# Altium footprint library SWLIB(150721).PcbLib: 348 footprints (part 3 of 22)
Each footprint in its own frame and in the unit in brackets; x right, y up, seen from the top. Pads: shape width x height; smd on the part's side, far side on the other; paste and mask are expansions set on the pad; w line width, h text height; cw(c..) or ccw(c..) is an arc to the next point about the centre after c.
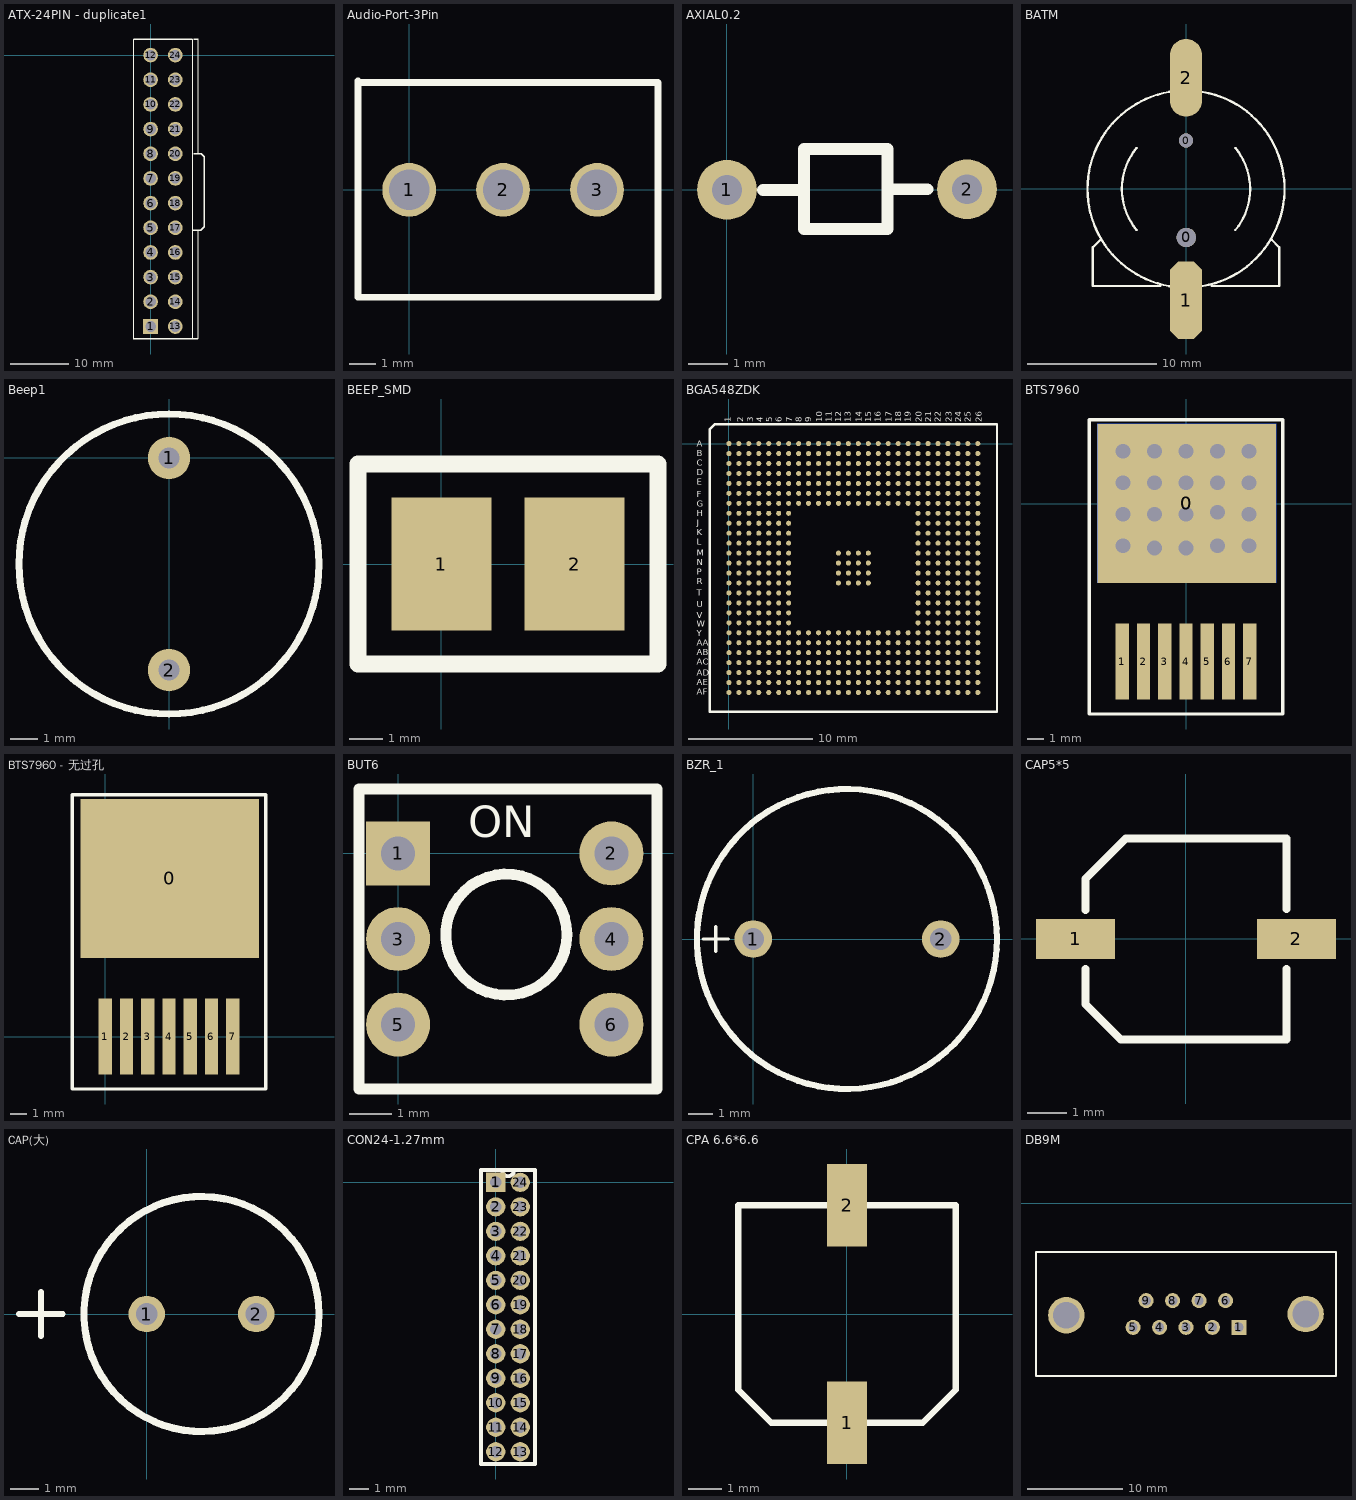
[diagram p2: the footprints below, top view; thin cyan lines are the x and y axes]

## ATX-24PIN - duplicate1 [mm]
pads (24):
  rect 2.5x2.5 hole 1.8: 1(0,-46.2)
  round 2.5 hole 1.8: 2(0,-42) 3(0,-37.8) 4(0,-33.6) 5(0,-29.4) 6(0,-25.2) 7(0,-21) 8(0,-16.8) 9(0,-12.6) 10(0,-8.4) 11(0,-4.2) 12(0,0) 13(4.216,-46.2) 14(4.216,-42) 15(4.216,-37.8) 16(4.216,-33.6) 17(4.216,-29.4) 18(4.216,-25.2) 19(4.216,-21) 20(4.216,-16.8) 21(4.216,-12.6) 22(4.216,-8.4) 23(4.216,-4.2) 24(4.216,0)
Top Overlay:
  lines w0.2: -2.896,-48.333 -2.896,2.667 ; 7.198,-48.26 7.198,2.74 ; 8.153,-48.26 8.153,-29.845 ; 8.153,-16.764 8.153,2.667
  lines w0.254: -2.896,2.667 7.104,2.667 ; -2.802,-48.26 7.198,-48.26 8.053,-48.26 ; 7.198,-29.845 8.534,-29.845 9.169,-29.21 9.169,-17.272 8.661,-16.764 7.391,-16.764 ; 7.325,2.667 8.153,2.667
Mechanical 1:
  circle w0.1: c4.217,-4.187 r0.901
  circle w0.1: c0.001,-4.187 r0.901
  circle w0.1: c4.217,0.013 r0.901
  circle w0.1: c0.001,0.013 r0.901
3D body: height 10, standoff 0.1, extent -0.902,-47.102 0.902,-45.298
3D body: height 10, standoff 0.1, extent 3.315,-47.102 5.118,-45.298
3D body: height 10, standoff 0.1, extent -0.902,-38.702 0.902,-36.898
3D body: height 10, standoff 0.1, extent 3.315,-38.702 5.118,-36.898
3D body: height 10, standoff 0.1, extent -0.902,-42.902 0.902,-41.098
3D body: height 10, standoff 0.1, extent 3.315,-42.902 5.118,-41.098
3D body: height 10, standoff 0.1, extent -0.902,-34.502 0.902,-32.698
3D body: height 10, standoff 0.1, extent 3.315,-34.502 5.118,-32.698
3D body: height 10, standoff 0.1, extent -0.902,-38.702 0.902,-36.898
3D body: height 10, standoff 0.1, extent 3.315,-38.702 5.118,-36.898
3D body: height 10, standoff 0.1, extent -0.902,-26.102 0.902,-24.298
3D body: height 10, standoff 0.1, extent 3.315,-26.102 5.118,-24.298
3D body: height 10, standoff 0.1, extent -0.902,-30.302 0.902,-28.498
3D body: height 10, standoff 0.1, extent 3.315,-30.302 5.118,-28.498
3D body: height 10, standoff 0.1, extent -0.902,-17.702 0.902,-15.898
3D body: height 10, standoff 0.1, extent 3.315,-17.702 5.118,-15.898
3D body: height 10, standoff 0.1, extent -0.902,-21.902 0.902,-20.098
3D body: height 10, standoff 0.1, extent 3.315,-21.902 5.118,-20.098
3D body: height 10, standoff 0.1, extent -0.902,-9.302 0.902,-7.498
3D body: height 10, standoff 0.1, extent 3.315,-9.302 5.118,-7.498
3D body: height 10, standoff 0.1, extent -0.902,-13.502 0.902,-11.698
3D body: height 10, standoff 0.1, extent 3.315,-13.502 5.118,-11.698
3D body: height 10, standoff 0.1, extent 3.315,-5.102 5.118,-3.298
3D body: height 10, standoff 0.1, extent -0.902,-5.102 0.902,-3.298
3D body: height 10, standoff 0.1, extent 3.315,-0.902 5.118,0.902
3D body: height 10, standoff 0.1, extent -0.902,-0.902 0.902,0.902
3D body: height 10, standoff 0.1, extent -2.845,1.829 -1.905,2.743
3D body: height 10, standoff 0.1, extent -2.946,-48.311 8.179,2.769

## Audio-Port-3Pin [mm]
pads (3):
  round 2 hole 1.5: 1(0,0) 2(3.5,0) 3(7,0)
Top Overlay:
  lines w0.254: -1.905,4 9.271,4 9.271,-4 -1.905,-4 -1.905,4.064

## AXIAL0.2 [mil]
pads (2):
  round 60 hole 30: 1(0,0) 2(240.5,0.55)
Top Overlay:
  lines w12: 36.32,0 76.32,0 ; 160.7,0.55 200.7,0.55 ; 77.05,-39.2 160.7,-39.2 160.7,40.8 77.05,40.8 77.05,-39.2

## BATM [mm]
pads (4):
  round 1.1 hole 1.1 unplated: 0(0,3.748)
  round 1.5 hole 1.5 unplated: 0(0.025,-3.752)
  oct 2.5x6 smd: 1(0,-8.602)
  oval 2.5x6 smd: 2(0,8.598)
Top Overlay:
  lines w0.178: -6.6,-3.902 -7.2,-4.502 -7.2,-7.502 -2,-7.502 ; -3.815,-3.171 cw(c0,-0.002) -3.812,3.171 ; -0.833,-7.576 cw(c0,-0.002) -7.62,-0.002 cw(c0,-0.002) -0.833,7.573 ; 0.833,-7.576 ccw(c0,-0.002) 0.833,7.573 ; 2,-7.502 7.2,-7.502 7.2,-4.502 6.625,-3.927 ; 3.81,-3.177 ccw(c0,-0.002) 3.812,3.171

## Beep1 [mil]
pads (2):
  round 60 hole 30: 1(0,0) 2(0,-300)
Top Overlay:
  circle w10: c0,-150 r212.13

## BEEP_SMD [mm]
pads (2):
  rect 3x4 smd: 1(0,0) 2(4,0)
Top Overlay:
  lines w0.5: -2.5,-3 6.5,-3 6.5,3 -2.5,3 -2.5,-3

## BGA548ZDK [mil]
pads (548):
  round 16 smd: A1(0,0) A2(31.5,0) A3(62.99,0) A4(94.49,0) A5(125.98,0) A6(157.48,0) A7(188.98,0) A8(220.47,0) A9(251.97,0) A10(283.46,0) A11(314.96,0) A12(346.46,0) A13(377.95,0) A14(409.45,0) A15(440.94,0) A16(472.44,0) A17(503.94,0) A18(535.43,0) A19(566.93,0) A20(598.43,0) A21(629.92,0) A22(661.42,0) A23(692.91,0) A24(724.41,0) A25(755.91,0) A26(787.4,0) AA1(0,-629.92) AA2(31.5,-629.92) AA3(62.99,-629.92) AA4(94.49,-629.92) AA5(125.98,-629.92) AA6(157.48,-629.92) AA7(188.98,-629.92) AA8(220.47,-629.92) AA9(251.97,-629.92) AA10(283.46,-629.92) AA11(314.96,-629.92) AA12(346.46,-629.92) AA13(377.95,-629.92) AA14(409.45,-629.92) AA15(440.94,-629.92) AA16(472.44,-629.92) AA17(503.94,-629.92) AA18(535.43,-629.92) AA19(566.93,-629.92) AA20(598.43,-629.92) AA21(629.92,-629.92) AA22(661.42,-629.92) AA23(692.91,-629.92) AA24(724.41,-629.92) AA25(755.91,-629.92) AA26(787.4,-629.92) AB1(0,-661.42) AB2(31.5,-661.42) AB3(62.99,-661.42) AB4(94.49,-661.42) AB5(125.98,-661.42) AB6(157.48,-661.42) AB7(188.98,-661.42) AB8(220.47,-661.42) AB9(251.97,-661.42) AB10(283.46,-661.42) AB11(314.96,-661.42) AB12(346.46,-661.42) AB13(377.95,-661.42) AB14(409.45,-661.42) AB15(440.94,-661.42) AB16(472.44,-661.42) AB17(503.94,-661.42) AB18(535.43,-661.42) AB19(566.93,-661.42) AB20(598.43,-661.42) AB21(629.92,-661.42) AB22(661.42,-661.42) AB23(692.91,-661.42) AB24(724.41,-661.42) AB25(755.91,-661.42) AB26(787.4,-661.42) AC1(0,-692.91) AC2(31.5,-692.91) AC3(62.99,-692.91) AC4(94.49,-692.91) AC5(125.98,-692.91) AC6(157.48,-692.91) AC7(188.98,-692.91) AC8(220.47,-692.91) AC9(251.97,-692.91) AC10(283.46,-692.91) AC11(314.96,-692.91) AC12(346.46,-692.91) AC13(377.95,-692.91) AC14(409.45,-692.91) AC15(440.94,-692.91) AC16(472.44,-692.91) AC17(503.94,-692.91) AC18(535.43,-692.91) AC19(566.93,-692.91) AC20(598.43,-692.91) AC21(629.92,-692.91) AC22(661.42,-692.91) AC23(692.91,-692.91) AC24(724.41,-692.91) AC25(755.91,-692.91) AC26(787.4,-692.91) AD1(0,-724.41) AD2(31.5,-724.41) AD3(62.99,-724.41) AD4(94.49,-724.41) AD5(125.98,-724.41) AD6(157.48,-724.41) AD7(188.98,-724.41) AD8(220.47,-724.41) AD9(251.97,-724.41) AD10(283.46,-724.41) AD11(314.96,-724.41) AD12(346.46,-724.41) AD13(377.95,-724.41) AD14(409.45,-724.41) AD15(440.94,-724.41) AD16(472.44,-724.41) AD17(503.94,-724.41) AD18(535.43,-724.41) AD19(566.93,-724.41) AD20(598.43,-724.41) AD21(629.92,-724.41) AD22(661.42,-724.41) AD23(692.91,-724.41) AD24(724.41,-724.41) AD25(755.91,-724.41) AD26(787.4,-724.41) AE1(0,-755.91) AE2(31.5,-755.91) AE3(62.99,-755.91) AE4(94.49,-755.91) AE5(125.98,-755.91) AE6(157.48,-755.91) AE7(188.98,-755.91) AE8(220.47,-755.91) AE9(251.97,-755.91) AE10(283.46,-755.91) AE11(314.96,-755.91) AE12(346.46,-755.91) AE13(377.95,-755.91) AE14(409.45,-755.91) AE15(440.94,-755.91) AE16(472.44,-755.91) AE17(503.94,-755.91) AE18(535.43,-755.91) AE19(566.93,-755.91) AE20(598.43,-755.91) AE21(629.92,-755.91) AE22(661.42,-755.91) AE23(692.91,-755.91) AE24(724.41,-755.91) AE25(755.91,-755.91) AE26(787.4,-755.91) AF1(0,-787.4) AF2(31.5,-787.4) AF3(62.99,-787.4) AF4(94.49,-787.4) AF5(125.98,-787.4) AF6(157.48,-787.4) AF7(188.98,-787.4) AF8(220.47,-787.4) AF9(251.97,-787.4) AF10(283.46,-787.4) AF11(314.96,-787.4) AF12(346.46,-787.4) AF13(377.95,-787.4) AF14(409.45,-787.4) AF15(440.94,-787.4) AF16(472.44,-787.4) AF17(503.94,-787.4) AF18(535.43,-787.4) AF19(566.93,-787.4) AF20(598.43,-787.4) AF21(629.92,-787.4) AF22(661.42,-787.4) AF23(692.91,-787.4) AF24(724.41,-787.4) AF25(755.91,-787.4) AF26(787.4,-787.4) B1(0,-31.5) B2(31.5,-31.5) B3(62.99,-31.5) B4(94.49,-31.5) B5(125.98,-31.5) B6(157.48,-31.5) B7(188.98,-31.5) B8(220.47,-31.5) B9(251.97,-31.5) B10(283.46,-31.5) B11(314.96,-31.5) B12(346.46,-31.5) B13(377.95,-31.5) B14(409.45,-31.5) B15(440.94,-31.5) B16(472.44,-31.5) B17(503.94,-31.5) B18(535.43,-31.5) B19(566.93,-31.5) B20(598.43,-31.5) B21(629.92,-31.5) B22(661.42,-31.5) B23(692.91,-31.5) B24(724.41,-31.5) B25(755.91,-31.5) B26(787.4,-31.5) C1(0,-62.99) C2(31.5,-62.99) C3(62.99,-62.99) C4(94.49,-62.99) C5(125.98,-62.99) C6(157.48,-62.99) C7(188.98,-62.99) C8(220.47,-62.99) C9(251.97,-62.99) C10(283.46,-62.99) C11(314.96,-62.99) C12(346.46,-62.99) C13(377.95,-62.99) C14(409.45,-62.99) C15(440.94,-62.99) C16(472.44,-62.99) C17(503.94,-62.99) C18(535.43,-62.99) C19(566.93,-62.99) C20(598.43,-62.99) C21(629.92,-62.99) C22(661.42,-62.99) C23(692.91,-62.99) C24(724.41,-62.99) C25(755.91,-62.99) C26(787.4,-62.99) D1(0,-94.49) D2(31.5,-94.49) D3(62.99,-94.49) D4(94.49,-94.49) D5(125.98,-94.49) D6(157.48,-94.49) D7(188.98,-94.49) D8(220.47,-94.49) D9(251.97,-94.49) D10(283.46,-94.49) D11(314.96,-94.49) D12(346.46,-94.49) D13(377.95,-94.49) D14(409.45,-94.49) D15(440.94,-94.49) D16(472.44,-94.49) D17(503.94,-94.49) D18(535.43,-94.49) D19(566.93,-94.49) D20(598.43,-94.49) D21(629.92,-94.49) D22(661.42,-94.49) D23(692.91,-94.49) D24(724.41,-94.49) D25(755.91,-94.49) D26(787.4,-94.49) E1(0,-125.98) E2(31.5,-125.98) E3(62.99,-125.98) E4(94.49,-125.98) E5(125.98,-125.98) E6(157.48,-125.98) E7(188.98,-125.98) E8(220.47,-125.98) E9(251.97,-125.98) E10(283.46,-125.98) E11(314.96,-125.98) E12(346.46,-125.98) E13(377.95,-125.98) E14(409.45,-125.98) E15(440.94,-125.98) E16(472.44,-125.98) E17(503.94,-125.98) E18(535.43,-125.98) E19(566.93,-125.98) E20(598.43,-125.98) E21(629.92,-125.98) E22(661.42,-125.98) E23(692.91,-125.98) E24(724.41,-125.98) E25(755.91,-125.98) E26(787.4,-125.98) F1(0,-157.48) F2(31.5,-157.48) F3(62.99,-157.48) F4(94.49,-157.48) F5(125.98,-157.48) F6(157.48,-157.48) F7(188.98,-157.48) F8(220.47,-157.48) F9(251.97,-157.48) F10(283.46,-157.48) F11(314.96,-157.48) F12(346.46,-157.48) F13(377.95,-157.48) F14(409.45,-157.48) F15(440.94,-157.48) F16(472.44,-157.48) F17(503.94,-157.48) F18(535.43,-157.48) F19(566.93,-157.48) F20(598.43,-157.48) F21(629.92,-157.48) F22(661.42,-157.48) F23(692.91,-157.48) F24(724.41,-157.48) F25(755.91,-157.48) F26(787.4,-157.48) G1(0,-188.98) G2(31.5,-188.98) G3(62.99,-188.98) G4(94.49,-188.98) G5(125.98,-188.98) G6(157.48,-188.98) G7(188.98,-188.98) G8(220.47,-188.98) G9(251.97,-188.98) G10(283.46,-188.98) G11(314.96,-188.98) G12(346.46,-188.98) G13(377.95,-188.98) G14(409.45,-188.98) G15(440.94,-188.98) G16(472.44,-188.98) G17(503.94,-188.98) G18(535.43,-188.98) G19(566.93,-188.98) G20(598.43,-188.98) G21(629.92,-188.98) G22(661.42,-188.98) G23(692.91,-188.98) G24(724.41,-188.98) G25(755.91,-188.98) G26(787.4,-188.98) H1(0,-220.47) H2(31.5,-220.47) H3(62.99,-220.47) H4(94.49,-220.47) H5(125.98,-220.47) H6(157.48,-220.47) H7(188.98,-220.47) H20(598.43,-220.47) H21(629.92,-220.47) H22(661.42,-220.47) H23(692.91,-220.47) H24(724.41,-220.47) H25(755.91,-220.47) H26(787.4,-220.47) J1(0,-251.97) J2(31.5,-251.97) J3(62.99,-251.97) J4(94.49,-251.97) J5(125.98,-251.97) J6(157.48,-251.97) J7(188.98,-251.97) J20(598.43,-251.97) J21(629.92,-251.97) J22(661.42,-251.97) J23(692.91,-251.97) J24(724.41,-251.97) J25(755.91,-251.97) J26(787.4,-251.97) K1(0,-283.46) K2(31.5,-283.46) K3(62.99,-283.46) K4(94.49,-283.46) K5(125.98,-283.46) K6(157.48,-283.46) K7(188.98,-283.46) K20(598.43,-283.46) K21(629.92,-283.46) K22(661.42,-283.46) K23(692.91,-283.46) K24(724.41,-283.46) K25(755.91,-283.46) K26(787.4,-283.46) L1(0,-314.96) L2(31.5,-314.96) L3(62.99,-314.96) L4(94.49,-314.96) L5(125.98,-314.96) L6(157.48,-314.96) L7(188.98,-314.96) L20(598.43,-314.96) L21(629.92,-314.96) L22(661.42,-314.96) L23(692.91,-314.96) L24(724.41,-314.96) L25(755.91,-314.96) L26(787.4,-314.96) M1(0,-346.46) M2(31.5,-346.46) M3(62.99,-346.46) M4(94.49,-346.46) M5(125.98,-346.46) M6(157.48,-346.46) M7(188.98,-346.46) M12(346.46,-346.46) M13(377.95,-346.46) M14(409.45,-346.46) M15(440.94,-346.46) M20(598.43,-346.46) M21(629.92,-346.46) M22(661.42,-346.46) M23(692.91,-346.46) M24(724.41,-346.46) M25(755.91,-346.46) M26(787.4,-346.46) N1(0,-377.95) N2(31.5,-377.95) N3(62.99,-377.95) N4(94.49,-377.95) N5(125.98,-377.95) N6(157.48,-377.95) N7(188.98,-377.95) N12(346.46,-377.95) N13(377.95,-377.95) N14(409.45,-377.95) N15(440.94,-377.95) N20(598.43,-377.95) N21(629.92,-377.95) N22(661.42,-377.95) N23(692.91,-377.95) N24(724.41,-377.95) N25(755.91,-377.95) N26(787.4,-377.95) P1(0,-409.45) P2(31.5,-409.45) P3(62.99,-409.45) P4(94.49,-409.45) P5(125.98,-409.45) P6(157.48,-409.45) P7(188.98,-409.45) P12(346.46,-409.45) P13(377.95,-409.45) P14(409.45,-409.45) P15(440.94,-409.45) P20(598.43,-409.45) P21(629.92,-409.45) P22(661.42,-409.45) P23(692.91,-409.45) P24(724.41,-409.45) P25(755.91,-409.45) P26(787.4,-409.45) R1(0,-440.94) R2(31.5,-440.94) R3(62.99,-440.94) R4(94.49,-440.94) R5(125.98,-440.94) R6(157.48,-440.94) R7(188.98,-440.94) R12(346.46,-440.94) R13(377.95,-440.94) R14(409.45,-440.94) R15(440.94,-440.94) R20(598.43,-440.94) R21(629.92,-440.94) R22(661.42,-440.94) R23(692.91,-440.94) R24(724.41,-440.94) R25(755.91,-440.94) R26(787.4,-440.94) T1(0,-472.44) T2(31.5,-472.44) T3(62.99,-472.44) T4(94.49,-472.44) T5(125.98,-472.44) T6(157.48,-472.44) T7(188.98,-472.44) T20(598.43,-472.44) T21(629.92,-472.44) T22(661.42,-472.44) T23(692.91,-472.44) T24(724.41,-472.44) T25(755.91,-472.44) T26(787.4,-472.44) U1(0,-503.94) U2(31.5,-503.94) U3(62.99,-503.94) U4(94.49,-503.94) U5(125.98,-503.94) U6(157.48,-503.94) U7(188.98,-503.94) U20(598.43,-503.94) U21(629.92,-503.94) U22(661.42,-503.94) U23(692.91,-503.94) U24(724.41,-503.94) U25(755.91,-503.94) U26(787.4,-503.94) V1(0,-535.43) V2(31.5,-535.43) V3(62.99,-535.43) V4(94.49,-535.43) V5(125.98,-535.43) V6(157.48,-535.43) V7(188.98,-535.43) V20(598.43,-535.43) V21(629.92,-535.43) V22(661.42,-535.43) V23(692.91,-535.43) V24(724.41,-535.43) V25(755.91,-535.43) V26(787.4,-535.43) W1(0,-566.93) W2(31.5,-566.93) W3(62.99,-566.93) W4(94.49,-566.93) W5(125.98,-566.93) W6(157.48,-566.93) W7(188.98,-566.93) W20(598.43,-566.93) W21(629.92,-566.93) W22(661.42,-566.93) W23(692.91,-566.93) W24(724.41,-566.93) W25(755.91,-566.93) W26(787.4,-566.93) Y1(0,-598.43) Y2(31.5,-598.43) Y3(62.99,-598.43) Y4(94.49,-598.43) Y5(125.98,-598.43) Y6(157.48,-598.43) Y7(188.98,-598.43) Y8(220.47,-598.43) Y9(251.97,-598.43) Y10(283.46,-598.43) Y11(314.96,-598.43) Y12(346.46,-598.43) Y13(377.95,-598.43) Y14(409.45,-598.43) Y15(440.94,-598.43) Y16(472.44,-598.43) Y17(503.94,-598.43) Y18(535.43,-598.43) Y19(566.93,-598.43) Y20(598.43,-598.43) Y21(629.92,-598.43) Y22(661.42,-598.43) Y23(692.91,-598.43) Y24(724.41,-598.43) Y25(755.91,-598.43) Y26(787.4,-598.43)
Top Overlay:
  lines w7.87: -10.34,60.73 -45.62,60.73 ; -45.62,60.73 -61.36,44.98 -61.36,-848.72 848.09,-848.72 848.09,60.73 -45.62,60.73
  text "26" at 800,66.98 h20
  text "25" at 765,66.98 h20
  text "24" at 735,66.98 h20
  text "23" at 705,66.98 h20
  text "22" at 670,66.98 h20
  text "21" at 640,66.98 h20
  text "20" at 610,66.98 h20
  text "19" at 575,66.98 h20
  text "18" at 545,66.98 h20
  text "17" at 515,66.98 h20
  text "16" at 480,66.98 h20
  text "15" at 450,66.98 h20
  text "14" at 420,66.98 h20
  text "13" at 385,66.98 h20
  text "12" at 355,66.98 h20
  text "11" at 325,66.98 h20
  text "10" at 295,66.98 h20
  text "9" at 260,66.98 h20
  text "8" at 230,66.98 h20
  text "7" at 200,66.98 h20
  text "6" at 167,66.98 h20
  text "5" at 137,66.98 h20
  text "4" at 107,66.98 h20
  text "3" at 77,66.98 h20
  text "2" at 45,66.98 h20
  text "1" at 5,66.98 h20
  text "Y" at -101,-610 h20
  text "G" at -101,-200 h20
  text "D" at -101,-100 h20
  text "AF" at -101,-795 h20
  text "AE" at -101,-765 h20
  text "AD" at -101,-735 h20
  text "AC" at -101,-700 h20
  text "AB" at -101,-670 h20
  text "AA" at -101,-640 h20
  text "W" at -101,-580 h20
  text "V" at -101,-552 h20
  text "U" at -101,-517 h20
  text "T" at -101,-482 h20
  text "R" at -101,-445 h20
  text "P" at -101,-415 h20
  text "N" at -101,-385 h20
  text "M" at -101,-355 h20
  text "L" at -101,-320 h20
  text "K" at -101,-290 h20
  text "J" at -101,-260 h20
  text "H" at -101,-230 h20
  text "F" at -101,-170 h20
  text "E" at -101,-130 h20
  text "C" at -101,-70 h20
  text "B" at -101,-40 h20
  text "A" at -101,-10 h20

## BTS7960 [mm]
pads (9):
  rect 10.8x9.6 smd: 0(0.04,0.02)
  rect 10.8x9.6 smd far side: 0(0.04,0.02)
  rect 0.8x4.6 smd: 1(-3.85,-9.53) 2(-2.567,-9.53) 3(-1.283,-9.53) 4(0,-9.53) 5(1.283,-9.53) 6(2.567,-9.53) 7(3.85,-9.53)
via 3.81,-2.54 diameter 1.27 hole 0.889
via 1.905,-2.54 diameter 1.27 hole 0.889
via 0,-2.667 diameter 1.27 hole 0.889
via -1.905,-2.667 diameter 1.27 hole 0.889
via -3.81,-2.54 diameter 1.27 hole 0.889
via 3.81,-0.635 diameter 1.27 hole 0.889
via 1.905,-0.508 diameter 1.27 hole 0.889
via 0,-0.635 diameter 1.27 hole 0.889
via -1.905,-0.635 diameter 1.27 hole 0.889
via -3.81,-0.635 diameter 1.27 hole 0.889
via 3.81,1.27 diameter 1.27 hole 0.889
via 1.905,1.27 diameter 1.27 hole 0.889
via 0,1.27 diameter 1.27 hole 0.889
via -1.905,1.27 diameter 1.27 hole 0.889
via -3.81,1.27 diameter 1.27 hole 0.889
via 3.81,3.175 diameter 1.27 hole 0.889
via 1.905,3.175 diameter 1.27 hole 0.889
via 0,3.175 diameter 1.27 hole 0.889
via -1.905,3.175 diameter 1.27 hole 0.889
via -3.81,3.175 diameter 1.27 hole 0.889
Top Overlay:
  lines w0.203: -5.842,-12.7 5.842,-12.7 5.842,5.08 -5.842,5.08 -5.842,-12.7

## BTS7960 - 无过孔 [mm]
pads (8):
  rect 10.8x9.6 smd: 0(3.89,9.55)
  rect 0.8x4.6 smd: 1(0,0) 2(1.283,0) 3(2.567,0) 4(3.85,0) 5(5.133,0) 6(6.417,0) 7(7.7,0)
Top Overlay:
  lines w0.203: -1.992,-3.17 9.692,-3.17 9.692,14.61 -1.992,14.61 -1.992,-3.17

## BUT6 [mm]
pads (6):
  rect 1.5x1.5 hole 0.8: 1(0,-0.002)
  round 1.5 hole 0.8: 2(5.004,-0.002) 3(0,-2.008) 4(5.004,-2.008) 5(0,-4.015) 6(5.004,-4.015)
Top Overlay:
  circle w0.254: c2.54,-1.905 r1.42
  lines w0.254: -0.914,-5.526 6.071,-5.526 6.071,1.51 -0.914,1.51 -0.914,-5.526
  text "ON" at 1.651,0.127 h1.27

## BZR_1 [mil]
pads (2):
  round 60 hole 35: 1(0,0) 2(300,0)
Top Overlay:
  circle w10: c150,0 r240
  lines w5: -80,0 -40,0 ; -60,-20 -60,20

## CAP5*5 [mm]
pads (2):
  rect 2x1 smd: 1(-2.794,0) 2(2.794,0)
Top Overlay:
  lines w0.2: -2.54,-0.762 -2.54,-1.651 -1.651,-2.54 2.54,-2.54 2.54,-0.762 ; -2.54,0.73 -2.54,1.524 -1.524,2.54 2.54,2.54 2.54,0.762
3D body "SL-B.STEP": height 5.2, standoff 0, extent -2.274,-2.15 2.326,2.15

## CAP(大) [mil]
pads (2):
  round 50 hole 30: 1(0,0) 2(150,0)
Top Overlay:
  circle w10: c75,0 r161.01
  lines w8: -175,0 -115,0 ; -145,-30 -145,30

## CON24-1.27mm [mm]
pads (24):
  rect 1x1 hole 0.6: 1(0,0)
  round 1 hole 0.6: 2(0,-1.27) 3(0,-2.54) 4(0,-3.81) 5(0,-5.08) 6(0,-6.35) 7(0,-7.62) 8(0,-8.89) 9(0,-10.16) 10(0,-11.43) 11(0,-12.7) 12(0,-13.97) 13(1.27,-13.97) 14(1.27,-12.7) 15(1.27,-11.43) 16(1.27,-10.16) 17(1.27,-8.89) 18(1.27,-7.62) 19(1.27,-6.35) 20(1.27,-5.08) 21(1.27,-3.81) 22(1.27,-2.54) 23(1.27,-1.27) 24(1.27,0)
Top Overlay:
  lines w0.2: -0.762,-14.605 2.032,-14.605 2.032,0.635 0.318,0.635 ccw(c0.635,0.635) 0.953,0.635 -0.762,0.635 -0.762,-14.605
3D body: height 5, standoff 0.1, extent -0.686,-14.554 2.057,0.635

## CPA 6.6*6.6 [mm]
pads (2):
  rect 1.2x2.5 smd: 1(0,-3.3) 2(0,3.3)
Top Overlay:
  lines w0.2: -3.3,-2.3 -2.3,-3.3 2.3,-3.3 3.3,-2.3 3.3,3.3 0,3.3 -3.3,3.3 -3.3,-2.3
3D body "SL-E.STEP": height 5.2, standoff 0, extent -3.275,-3.502 3.325,3.498

## DB9M [mil]
pads (11):
  rect 62x62 hole 38: 1(1038,-512)
  round 62 hole 38: 2(929,-512) 3(820,-512) 4(711,-512) 5(602,-512) 6(983,-402) 7(874,-402) 8(765,-402) 9(656,-402)
  round 150 hole 110: ""(327,-462) ""(1313,-457)
Top Overlay:
  lines w8: 202,-712 202,-202 1438,-202 1438,-712 202,-712
3D body: height 472.44, standoff 3.94, extent 202,-712 1438,-202